# Altium footprint library 常用元件封装库.PcbLib: 1310 footprints (part 45 of 83)
Each footprint in its own frame and in the unit in brackets; x right, y up, seen from the top. Pads: shape width x height; smd on the part's side, far side on the other; paste and mask are expansions set on the pad; w line width, h text height; cw(c..) or ccw(c..) is an arc to the next point about the centre after c.
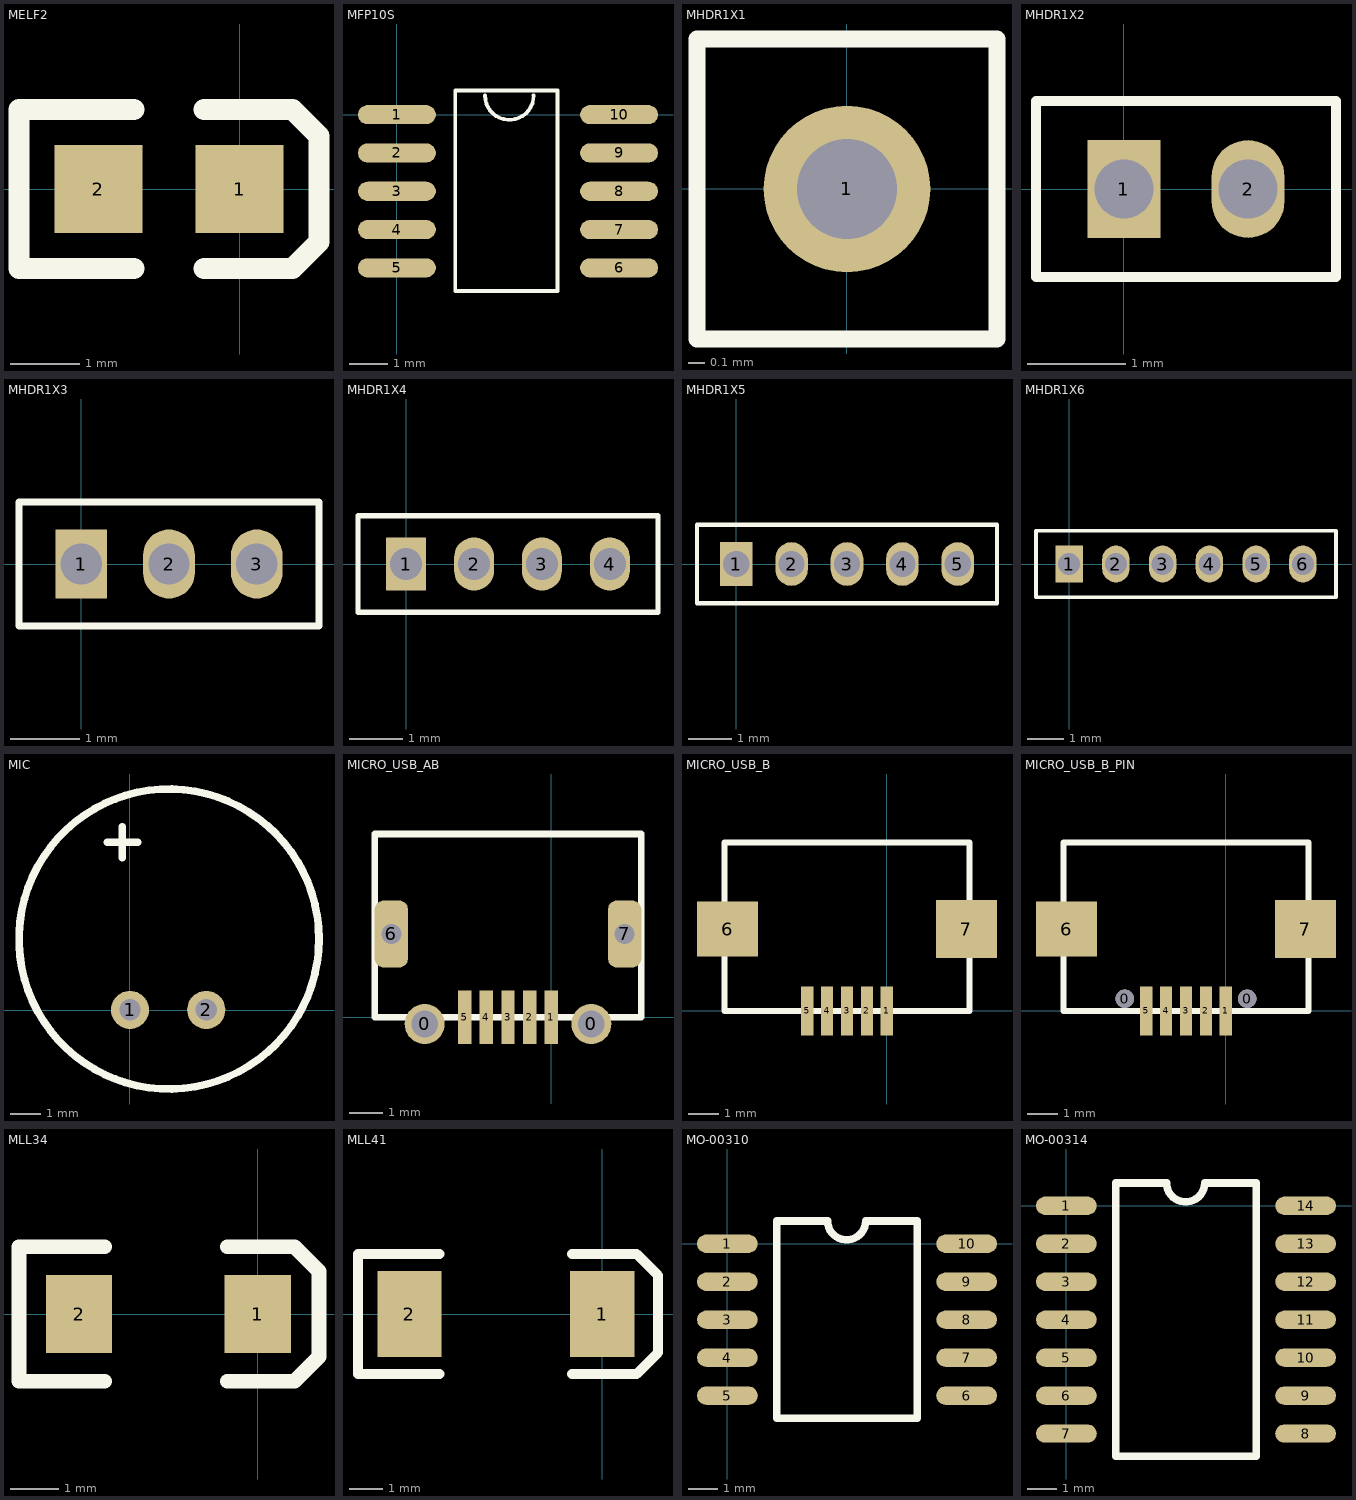
[diagram p44: the footprints below, top view; thin cyan lines are the x and y axes]

## MELF2 [mil]
pads (2):
  rect 50x50 smd: 1(0,0) 2(-80,0)
Top Overlay:
  lines w12: -60,-45 -125,-45 -125,45 -60,45 ; -20,-45 30,-45 45,-30 45,30 30,45 -20,45

## MFP10S [mm]
pads (10):
  oval 2.032x0.5 smd: 1(0,0) 2(0,-1) 3(0,-2) 4(0,-3) 5(0,-4) 6(5.8,-4) 7(5.8,-3) 8(5.8,-2) 9(5.8,-1) 10(5.8,0)
Top Overlay:
  lines w0.1: 2.3,0.5 ccw(c2.935,0.5) 3.57,0.5 ; 1.524,-4.6 1.524,0.635 4.191,0.635 4.191,-4.6 1.524,-4.6

## MHDR1X1 [mm]
pads (1):
  round 1 hole 0.6: 1(0,0)
Top Overlay:
  lines w0.102: -0.9,-0.9 0.9,-0.9 0.9,0.9 -0.9,0.9 -0.9,-0.9

## MHDR1X2 [mm]
pads (2):
  rect 0.746x1 hole 0.6: 1(0,0)
  oval 0.746x1 hole 0.6: 2(1.27,0)
Top Overlay:
  lines w0.102: -0.9,-0.9 2.17,-0.9 2.17,0.9 -0.9,0.9 -0.9,-0.9

## MHDR1X3 [mm]
pads (3):
  rect 0.746x1 hole 0.6: 1(0,0)
  oval 0.746x1 hole 0.6: 2(1.27,0) 3(2.54,0)
Top Overlay:
  lines w0.102: -0.9,-0.9 3.44,-0.9 3.44,0.9 -0.9,0.9 -0.9,-0.9

## MHDR1X4 [mm]
pads (4):
  rect 0.746x1 hole 0.6: 1(0,0)
  oval 0.746x1 hole 0.6: 2(1.27,0) 3(2.54,0) 4(3.81,0)
Top Overlay:
  lines w0.102: -0.9,-0.9 4.71,-0.9 4.71,0.9 -0.9,0.9 -0.9,-0.9

## MHDR1X5 [mm]
pads (5):
  rect 0.746x1 hole 0.6: 1(0,0)
  oval 0.746x1 hole 0.6: 2(1.27,0) 3(2.54,0) 4(3.81,0) 5(5.08,0)
Top Overlay:
  lines w0.102: -0.9,-0.9 5.98,-0.9 5.98,0.9 -0.9,0.9 -0.9,-0.9

## MHDR1X6 [mm]
pads (6):
  rect 0.746x1 hole 0.6: 1(0,0)
  oval 0.746x1 hole 0.6: 2(1.27,0) 3(2.54,0) 4(3.81,0) 5(5.08,0) 6(6.35,0)
Top Overlay:
  lines w0.102: -0.9,-0.9 7.25,-0.9 7.25,0.9 -0.9,0.9 -0.9,-0.9

## MIC [mil]
pads (2):
  round 50 hole 28: 1(0.42,0.29) 2(100.42,0.29)
Top Overlay:
  circle w10: c51.58,93.29 r196.85
  lines w10: -29.58,220.29 10.42,220.29 ; -9.58,200.29 -9.58,240.29

## MICRO_USB_AB [mm]
pads (9):
  round 1.2 hole 0.8: 0(-3.8,-0.2) 0(1.2,-0.2)
  rect 0.4x1.6 smd: 1(0,0) 2(-0.65,0) 3(-1.3,0) 4(-1.95,0) 5(-2.6,0)
  rrect50% 1x2 hole 0.6 square: 6(-4.8,2.5) 7(2.2,2.5)
Top Overlay:
  lines w0.2: -5.3,0 -5.3,5.5 2.7,5.5 2.7,0 -5.3,0
3D body "User Library-MicroUSB-B_Molex_105017-0001.STEP": height 2.75, standoff -0.56, extent -5.4,-0.415 2.8,5.015

## MICRO_USB_B [mm]
pads (7):
  rect 0.4x1.6 smd: 1(0,0) 2(-0.65,0) 3(-1.3,0) 4(-1.95,0) 5(-2.6,0)
  rect 2x1.8 smd: 6(-5.2,2.675)
  rect 2x1.9 smd: 7(2.6,2.675)
Top Overlay:
  lines w0.2: -5.3,0 -5.3,5.5 2.7,5.5 2.7,0 -5.3,0

## MICRO_USB_B_PIN [mm]
pads (9):
  round 0.6 hole 0.6: 0(-3.3,0.4) 0(0.7,0.4)
  rect 0.4x1.6 smd: 1(0,0) 2(-0.65,0) 3(-1.3,0) 4(-1.95,0) 5(-2.6,0)
  rect 2x1.8 smd: 6(-5.2,2.675)
  rect 2x1.9 smd: 7(2.6,2.675)
Top Overlay:
  lines w0.2: -5.3,0 -5.3,5.5 2.7,5.5 2.7,0 -5.3,0
3D body "User Library-MicroUSB-B_Molex_105017-0001.STEP": height 2.75, standoff -0.56, extent -5.4,-0.35 2.8,5.08

## MLL34 [mil]
pads (2):
  rect 54x64 smd: 1(0,0) 2(-146,0)
Top Overlay:
  lines w12: -125,-55 -195,-55 -195,55 -125,55 ; -25,-55 30,-55 50,-35 50,35 30,55 -25,55

## MLL41 [mil]
pads (2):
  rect 75x100 smd: 1(0,0) 2(-225,0)
Top Overlay:
  lines w12: -190,-70 -285,-70 -285,70 -190,70 ; -35,-70 40,-70 65,-45 65,45 40,70 -35,70

## MO-00310 [mil]
pads (10):
  oval 80x24 smd: 1(0,0) 2(0,-50) 3(0,-100) 4(0,-150) 5(0,-200) 6(315,-200) 7(315,-150) 8(315,-100) 9(315,-50) 10(315,0)
Top Overlay:
  lines w10: 65,-230 65,30 132,30 ccw(c157,30) 182,30 250,30 250,-230 65,-230

## MO-00314 [mil]
pads (14):
  oval 80x24 smd: 1(0,0) 2(0,-50) 3(0,-100) 4(0,-150) 5(0,-200) 6(0,-250) 7(0,-300) 8(315,-300) 9(315,-250) 10(315,-200) 11(315,-150) 12(315,-100) 13(315,-50) 14(315,0)
Top Overlay:
  lines w10: 65,-330 250,-330 250,30 182,30 cw(c157,30) 132,30 65,30 65,-330